# Altium schematic symbol library Regulator_Linear.SchLib: 1538 symbols (part 9 of 9)
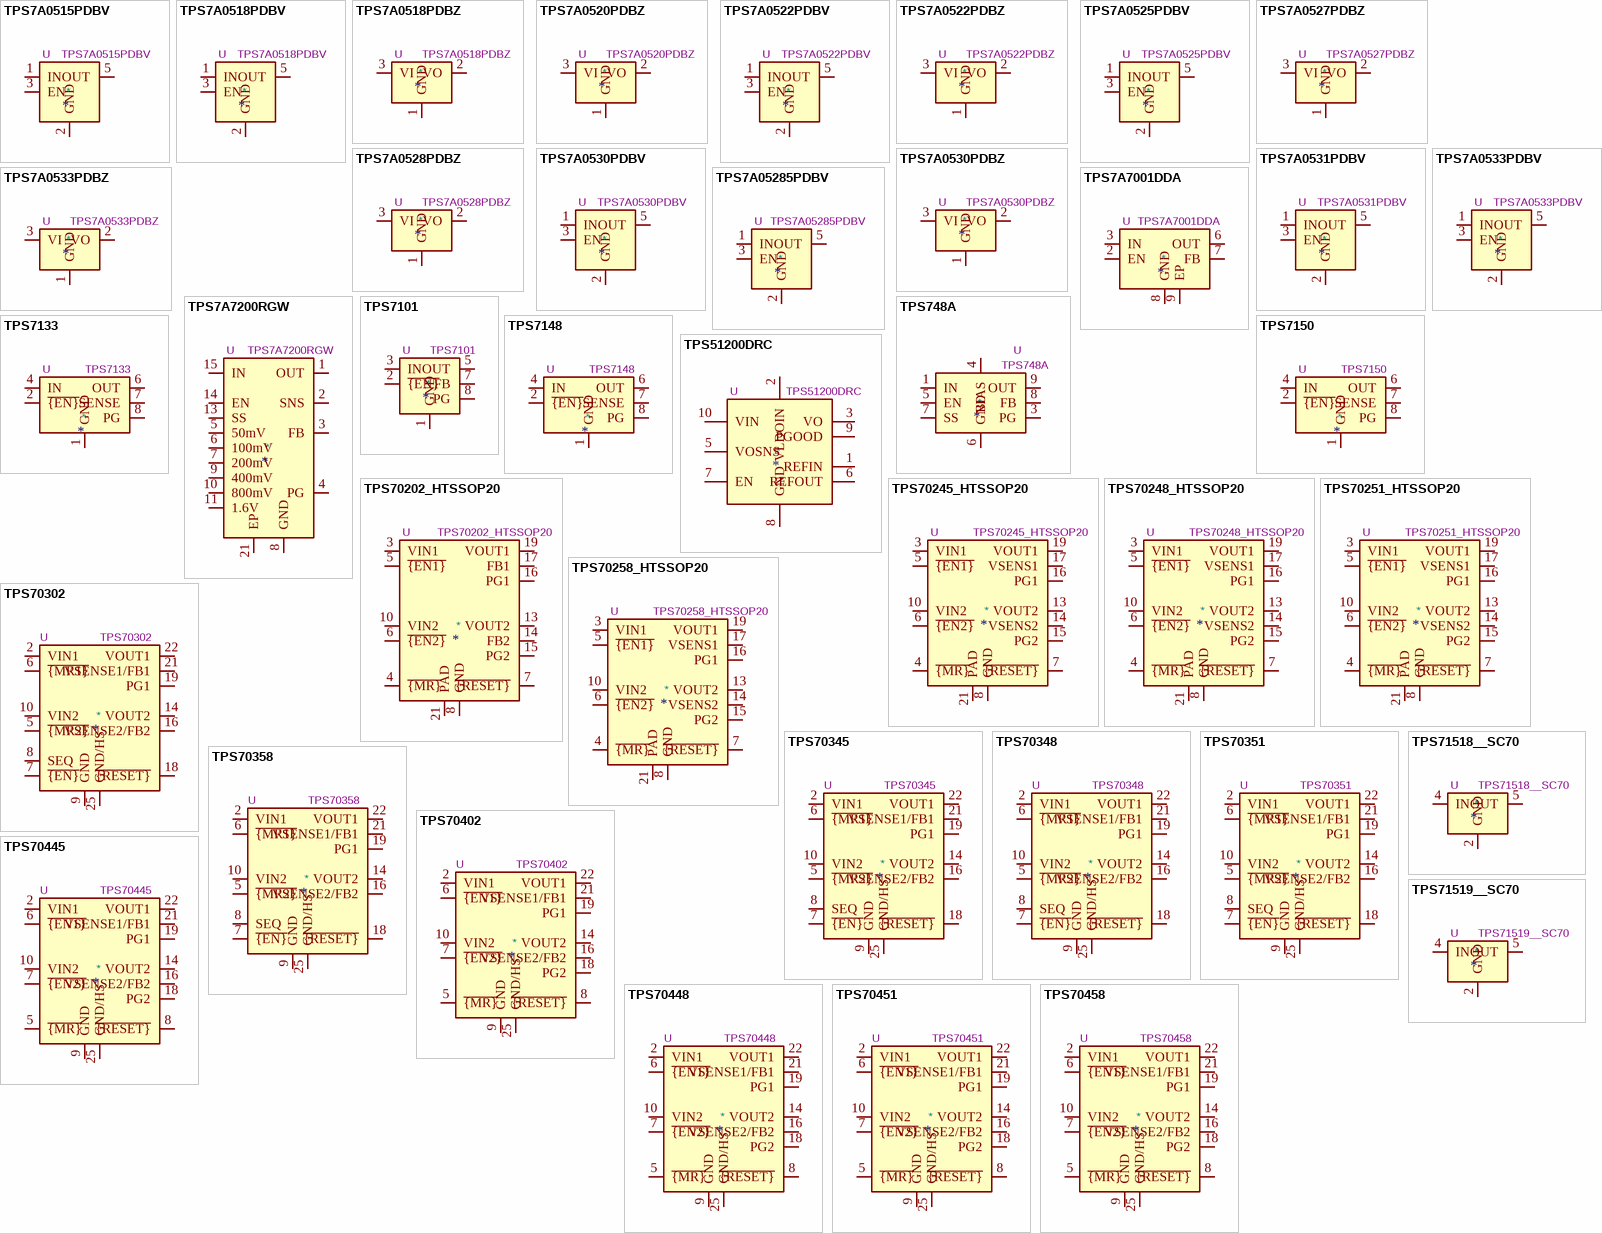
[diagram p46: symbols TPS7A0515PDBV to TPS71519__SC70]

## TPS70358
designator *  value TPS70358  Reference: U
ki_keywords: dual ldo regulator; ki_description: Dual-Output, Low Dropout Voltage Regulators With Integrated SVS For Split Voltage Systems, Sequenced Outputs, 3.3V 1A/2.5V 2A, HTSSOP-24; ki_fp_filters: HTSSOP*4.4x7.8mm*P0.65mm*; Footprint: Package_SO:HTSSOP-24-1EP_4.4x7.8mm_P0.65mm_EP3.4x7.8mm_Mask2.4x4.68mm_ThermalVias; Datasheet: http://www.ti.com/lit/ds/symlink/tps703.pdf
pins: 1 GND/HS hidden, 2 VIN1, 3 VIN1 hidden, 4 NC hidden, 5 ~{{MR2}}, 6 ~{{MR1}}, 7 ~{{EN}}, 8 SEQ, 9 GND, 10 VIN2, 11 VIN2 hidden, 12 GND/HS hidden, 13 GND/HS hidden, 14 VOUT2, 15 VOUT2 hidden, 16 VSENSE2/FB2, 17 NC hidden, 18 ~{{RESET}}, 19 PG1, 20 NC hidden, 21 VSENSE1/FB1, 22 VOUT1, 23 VOUT1 hidden, 24 GND/HS hidden, 25 GND/HS

## TPS70402
designator *  value TPS70402  Reference: U
ki_keywords: dual ldo regulator; ki_description: Dual-Output, Low Dropout Voltage Regulators With Integrated SVS For Split Voltage Systems, Independent Enable, ADJ 1A/ADJ 2A, HTSSOP-24; ki_fp_filters: HTSSOP*4.4x7.8mm*P0.65mm*; Footprint: Package_SO:HTSSOP-24-1EP_4.4x7.8mm_P0.65mm_EP3.4x7.8mm_Mask2.4x4.68mm_ThermalVias; Datasheet: http://www.ti.com/lit/ds/symlink/tps704.pdf
pins: 1 GND/HS hidden, 2 VIN1, 3 VIN1 hidden, 4 NC hidden, 5 ~{{MR}}, 6 ~{{EN1}}, 7 ~{{EN2}}, 8 ~{{RESET}}, 9 GND, 10 VIN2, 11 VIN2 hidden, 12 GND/HS hidden, 13 GND/HS hidden, 14 VOUT2, 15 VOUT2 hidden, 16 VSENSE2/FB2, 17 NC hidden, 18 PG2, 19 PG1, 20 NC hidden, 21 VSENSE1/FB1, 22 VOUT1, 23 VOUT1 hidden, 24 GND/HS hidden, 25 GND/HS

## TPS70445
designator *  value TPS70445  Reference: U
ki_keywords: dual ldo regulator; ki_description: Dual-Output, Low Dropout Voltage Regulators With Integrated SVS For Split Voltage Systems, Independent Enable, 3.3V 1A/1.2V 2A, HTSSOP-24; ki_fp_filters: HTSSOP*4.4x7.8mm*P0.65mm*; Footprint: Package_SO:HTSSOP-24-1EP_4.4x7.8mm_P0.65mm_EP3.4x7.8mm_Mask2.4x4.68mm_ThermalVias; Datasheet: http://www.ti.com/lit/ds/symlink/tps704.pdf
pins: 1 GND/HS hidden, 2 VIN1, 3 VIN1 hidden, 4 NC hidden, 5 ~{{MR}}, 6 ~{{EN1}}, 7 ~{{EN2}}, 8 ~{{RESET}}, 9 GND, 10 VIN2, 11 VIN2 hidden, 12 GND/HS hidden, 13 GND/HS hidden, 14 VOUT2, 15 VOUT2 hidden, 16 VSENSE2/FB2, 17 NC hidden, 18 PG2, 19 PG1, 20 NC hidden, 21 VSENSE1/FB1, 22 VOUT1, 23 VOUT1 hidden, 24 GND/HS hidden, 25 GND/HS

## TPS70448
designator *  value TPS70448  Reference: U
ki_keywords: dual ldo regulator; ki_description: Dual-Output, Low Dropout Voltage Regulators With Integrated SVS For Split Voltage Systems, Independent Enable, 3.3V 1A/1.5V 2A, HTSSOP-24; ki_fp_filters: HTSSOP*4.4x7.8mm*P0.65mm*; Footprint: Package_SO:HTSSOP-24-1EP_4.4x7.8mm_P0.65mm_EP3.4x7.8mm_Mask2.4x4.68mm_ThermalVias; Datasheet: http://www.ti.com/lit/ds/symlink/tps704.pdf
pins: 1 GND/HS hidden, 2 VIN1, 3 VIN1 hidden, 4 NC hidden, 5 ~{{MR}}, 6 ~{{EN1}}, 7 ~{{EN2}}, 8 ~{{RESET}}, 9 GND, 10 VIN2, 11 VIN2 hidden, 12 GND/HS hidden, 13 GND/HS hidden, 14 VOUT2, 15 VOUT2 hidden, 16 VSENSE2/FB2, 17 NC hidden, 18 PG2, 19 PG1, 20 NC hidden, 21 VSENSE1/FB1, 22 VOUT1, 23 VOUT1 hidden, 24 GND/HS hidden, 25 GND/HS

## TPS70451
designator *  value TPS70451  Reference: U
ki_keywords: dual ldo regulator; ki_description: Dual-Output, Low Dropout Voltage Regulators With Integrated SVS For Split Voltage Systems, Independent Enable, 3.3V 1A/1.8V 2A, HTSSOP-24; ki_fp_filters: HTSSOP*4.4x7.8mm*P0.65mm*; Footprint: Package_SO:HTSSOP-24-1EP_4.4x7.8mm_P0.65mm_EP3.4x7.8mm_Mask2.4x4.68mm_ThermalVias; Datasheet: http://www.ti.com/lit/ds/symlink/tps704.pdf
pins: 1 GND/HS hidden, 2 VIN1, 3 VIN1 hidden, 4 NC hidden, 5 ~{{MR}}, 6 ~{{EN1}}, 7 ~{{EN2}}, 8 ~{{RESET}}, 9 GND, 10 VIN2, 11 VIN2 hidden, 12 GND/HS hidden, 13 GND/HS hidden, 14 VOUT2, 15 VOUT2 hidden, 16 VSENSE2/FB2, 17 NC hidden, 18 PG2, 19 PG1, 20 NC hidden, 21 VSENSE1/FB1, 22 VOUT1, 23 VOUT1 hidden, 24 GND/HS hidden, 25 GND/HS

## TPS70458
designator *  value TPS70458  Reference: U
ki_keywords: dual ldo regulator; ki_description: Dual-Output, Low Dropout Voltage Regulators With Integrated SVS For Split Voltage Systems, Independent Enable, 3.3V 1A/2.5V 2A, HTSSOP-24; ki_fp_filters: HTSSOP*4.4x7.8mm*P0.65mm*; Footprint: Package_SO:HTSSOP-24-1EP_4.4x7.8mm_P0.65mm_EP3.4x7.8mm_Mask2.4x4.68mm_ThermalVias; Datasheet: http://www.ti.com/lit/ds/symlink/tps704.pdf
pins: 1 GND/HS hidden, 2 VIN1, 3 VIN1 hidden, 4 NC hidden, 5 ~{{MR}}, 6 ~{{EN1}}, 7 ~{{EN2}}, 8 ~{{RESET}}, 9 GND, 10 VIN2, 11 VIN2 hidden, 12 GND/HS hidden, 13 GND/HS hidden, 14 VOUT2, 15 VOUT2 hidden, 16 VSENSE2/FB2, 17 NC hidden, 18 PG2, 19 PG1, 20 NC hidden, 21 VSENSE1/FB1, 22 VOUT1, 23 VOUT1 hidden, 24 GND/HS hidden, 25 GND/HS

## TPS71518__SC70
designator *  value TPS71518__SC70  Reference: U
ki_keywords: LDO regulator voltage; ki_description: Low-drop Voltage Regulator, Io up to 50mA, Fixed Vo 1.8V, Ignd 3.2uA , SC70.; ki_fp_filters: *SC?70*; Footprint: Package_TO_SOT_SMD:SOT-353_SC-70-5; Datasheet: http://www.ti.com/lit/ds/symlink/tps715.pdf
pins: 1 NC hidden, 2 GND, 3 NC hidden, 4 IN, 5 OUT

## TPS71519__SC70
designator *  value TPS71519__SC70  Reference: U
ki_keywords: LDO regulator voltage; ki_description: Low-drop Voltage Regulator, Io up to 50mA, Fixed Vo 1.9V, Ignd 3.2uA , SC70.; ki_fp_filters: *SC?70*; Footprint: Package_TO_SOT_SMD:SOT-353_SC-70-5; Datasheet: http://www.ti.com/lit/ds/symlink/tps715.pdf
pins: 1 NC hidden, 2 GND, 3 NC hidden, 4 IN, 5 OUT

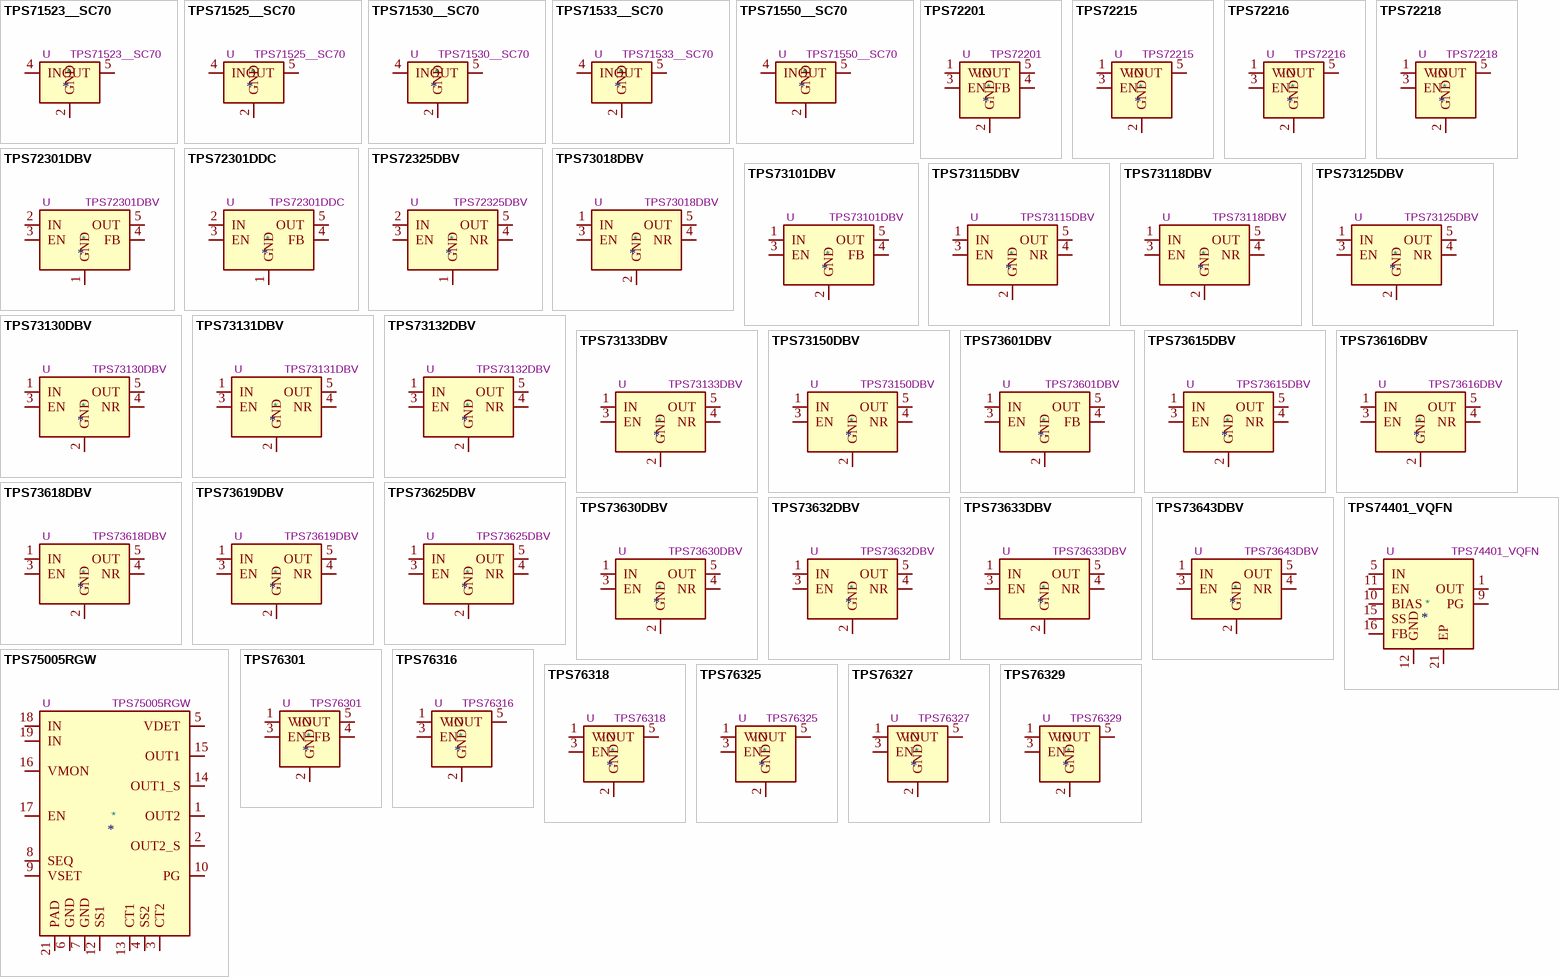
[diagram p36: symbols TPS71523__SC70 to TPS76329]

## TPS71523__SC70
designator *  value TPS71523__SC70  Reference: U
ki_keywords: LDO regulator voltage; ki_description: Low-drop Voltage Regulator, Io up to 50mA, Fixed Vo 2.3V, Ignd 3.2uA , SC70.; ki_fp_filters: *SC?70*; Footprint: Package_TO_SOT_SMD:SOT-353_SC-70-5; Datasheet: http://www.ti.com/lit/ds/symlink/tps715.pdf
pins: 1 NC hidden, 2 GND, 3 NC hidden, 4 IN, 5 OUT

## TPS71525__SC70
designator *  value TPS71525__SC70  Reference: U
ki_keywords: LDO regulator voltage; ki_description: Low-drop Voltage Regulator, Io up to 50mA, Fixed Vo 2.5V, Ignd 3.2uA , SC70.; ki_fp_filters: *SC?70*; Footprint: Package_TO_SOT_SMD:SOT-353_SC-70-5; Datasheet: http://www.ti.com/lit/ds/symlink/tps715.pdf
pins: 1 NC hidden, 2 GND, 3 NC hidden, 4 IN, 5 OUT

## TPS71530__SC70
designator *  value TPS71530__SC70  Reference: U
ki_keywords: LDO regulator voltage; ki_description: Low-drop Voltage Regulator, Io up to 50mA, Fixed Vo 3V, Ignd 3.2uA , SC70.; ki_fp_filters: *SC?70*; Footprint: Package_TO_SOT_SMD:SOT-353_SC-70-5; Datasheet: http://www.ti.com/lit/ds/symlink/tps715.pdf
pins: 1 NC hidden, 2 GND, 3 NC hidden, 4 IN, 5 OUT

## TPS71533__SC70
designator *  value TPS71533__SC70  Reference: U
ki_keywords: LDO regulator voltage; ki_description: Low-drop Voltage Regulator, Io up to 50mA, Fixed Vo 3.3V, Ignd 3.2uA , SC70.; ki_fp_filters: *SC?70*; Footprint: Package_TO_SOT_SMD:SOT-353_SC-70-5; Datasheet: http://www.ti.com/lit/ds/symlink/tps715.pdf
pins: 1 NC hidden, 2 GND, 3 NC hidden, 4 IN, 5 OUT

## TPS71550__SC70
designator *  value TPS71550__SC70  Reference: U
ki_keywords: LDO regulator voltage; ki_description: Low-drop Voltage Regulator, Io up to 50mA, Fixed Vo 5V, Ignd 3.2uA , SC70.; ki_fp_filters: *SC?70*; Footprint: Package_TO_SOT_SMD:SOT-353_SC-70-5; Datasheet: http://www.ti.com/lit/ds/symlink/tps715.pdf
pins: 1 NC hidden, 2 GND, 3 NC hidden, 4 IN, 5 OUT

## TPS72201
designator *  value TPS72201  Reference: U
ki_keywords: linear low dropout Regulator adjustable; ki_description: Low input voltage 50mA LDO variable output voltage, SOT-23-5; ki_fp_filters: SOT?23*; Footprint: Package_TO_SOT_SMD:SOT-23-5; Datasheet: http://www.ti.com/lit/ds/symlink/tps722.pdf
pins: 1 VIN, 2 GND, 3 EN, 4 FB, 5 VOUT

## TPS72215
designator *  value TPS72215  Reference: U
ki_keywords: linear low dropout Regulator fixed; ki_description: Low input voltage 50mA LDO, 1.5V fixed output voltage, SOT-23-5; ki_fp_filters: SOT?23*; Footprint: Package_TO_SOT_SMD:SOT-23-5; Datasheet: http://www.ti.com/lit/ds/symlink/tps722.pdf
pins: 1 VIN, 2 GND, 3 EN, 4 NC hidden, 5 VOUT

## TPS72216
designator *  value TPS72216  Reference: U
ki_keywords: linear low dropout Regulator fixed; ki_description: Low input voltage 50mA LDO, 1.6V fixed output voltage, SOT-23-5; ki_fp_filters: SOT?23*; Footprint: Package_TO_SOT_SMD:SOT-23-5; Datasheet: http://www.ti.com/lit/ds/symlink/tps722.pdf
pins: 1 VIN, 2 GND, 3 EN, 4 NC hidden, 5 VOUT

## TPS72218
designator *  value TPS72218  Reference: U
ki_keywords: linear low dropout Regulator fixed; ki_description: Low input voltage 50mA LDO, 1.8V fixed output voltage, SOT-23-5; ki_fp_filters: SOT?23*; Footprint: Package_TO_SOT_SMD:SOT-23-5; Datasheet: http://www.ti.com/lit/ds/symlink/tps722.pdf
pins: 1 VIN, 2 GND, 3 EN, 4 NC hidden, 5 VOUT

## TPS72301DBV
designator *  value TPS72301DBV  Reference: U
ki_description: 200-mA, Low-Noise, High-PSRR, Negative Output Low-Dropout Linear Regulator, Adjustable Output (-1.2 V to -10 V), SOT-23-5; ki_fp_filters: SOT?23*; Footprint: Package_TO_SOT_SMD:SOT-23-5; Datasheet: https://www.ti.com/lit/ds/symlink/tps723.pdf
pins: 1 GND, 2 IN, 3 EN, 4 FB, 5 OUT

## TPS72301DDC
designator *  value TPS72301DDC  Reference: U
ki_description: 200-mA, Low-Noise, High-PSRR, Negative Output Low-Dropout Linear Regulator, Adjustable Output (-1.2 V to -10 V), TSOT-23-5; ki_fp_filters: TSOT?23*; Footprint: Package_TO_SOT_SMD:TSOT-23-5; Datasheet: https://www.ti.com/lit/ds/symlink/tps723.pdf
pins: 1 GND, 2 IN, 3 EN, 4 FB, 5 OUT

## TPS72325DBV
designator *  value TPS72325DBV  Reference: U
ki_description: 200-mA, Low-Noise, High-PSRR, Negative Output Low-Dropout Linear Regulator, Fixed Output -2.5 V, SOT-23-5; ki_fp_filters: SOT?23*; Footprint: Package_TO_SOT_SMD:SOT-23-5; Datasheet: https://www.ti.com/lit/ds/symlink/tps723.pdf
pins: 1 GND, 2 IN, 3 EN, 4 NR, 5 OUT

## TPS73018DBV
designator *  value TPS73018DBV  Reference: U
ki_keywords: Fixed LDO 200mA; ki_description: Low Noise, High PSRR, 200mA Low Drop 1.8V Regulator, SOT-23-5; ki_fp_filters: SOT?23*; Footprint: Package_TO_SOT_SMD:SOT-23-5; Datasheet: https://www.ti.com/lit/ds/symlink/tps730.pdf
pins: 1 IN, 2 GND, 3 EN, 4 NR, 5 OUT

## TPS73101DBV
designator *  value TPS73101DBV  Reference: U
ki_keywords: Cap free Adjustable LDO 150mA; ki_description: Cap free NMOS 150mA Low Drop Adjustable Out Regulator, SOT-23-5; ki_fp_filters: SOT?23*; Footprint: Package_TO_SOT_SMD:SOT-23-5; Datasheet: http://www.ti.com/lit/ds/symlink/tps731.pdf
pins: 1 IN, 2 GND, 3 EN, 4 FB, 5 OUT

## TPS73115DBV
designator *  value TPS73115DBV  Reference: U
ki_keywords: Cap free Fixed LDO 150mA; ki_description: Cap free NMOS 150mA Low Drop 1.5V Regulator, SOT-23-5; ki_fp_filters: SOT?23*; Footprint: Package_TO_SOT_SMD:SOT-23-5; Datasheet: http://www.ti.com/lit/ds/symlink/tps731.pdf
pins: 1 IN, 2 GND, 3 EN, 4 NR, 5 OUT

## TPS73118DBV
designator *  value TPS73118DBV  Reference: U
ki_keywords: Cap free Fixed LDO 150mA; ki_description: Cap free NMOS 150mA Low Drop 1.8V Regulator, SOT-23-5; ki_fp_filters: SOT?23*; Footprint: Package_TO_SOT_SMD:SOT-23-5; Datasheet: http://www.ti.com/lit/ds/symlink/tps731.pdf
pins: 1 IN, 2 GND, 3 EN, 4 NR, 5 OUT

## TPS73125DBV
designator *  value TPS73125DBV  Reference: U
ki_keywords: Cap free Fixed LDO 150mA; ki_description: Cap free NMOS 150mA Low Drop 2.5V Regulator, SOT-23-5; ki_fp_filters: SOT?23*; Footprint: Package_TO_SOT_SMD:SOT-23-5; Datasheet: http://www.ti.com/lit/ds/symlink/tps731.pdf
pins: 1 IN, 2 GND, 3 EN, 4 NR, 5 OUT

## TPS73130DBV
designator *  value TPS73130DBV  Reference: U
ki_keywords: Cap free Fixed LDO 150mA; ki_description: Cap free NMOS 150mA Low Drop 3.0V Regulator, SOT-23-5; ki_fp_filters: SOT?23*; Footprint: Package_TO_SOT_SMD:SOT-23-5; Datasheet: http://www.ti.com/lit/ds/symlink/tps731.pdf
pins: 1 IN, 2 GND, 3 EN, 4 NR, 5 OUT

## TPS73131DBV
designator *  value TPS73131DBV  Reference: U
ki_keywords: Cap free Fixed LDO 150mA; ki_description: Cap free NMOS 150mA Low Drop 3.1V Regulator, SOT-23-5; ki_fp_filters: SOT?23*; Footprint: Package_TO_SOT_SMD:SOT-23-5; Datasheet: http://www.ti.com/lit/ds/symlink/tps731.pdf
pins: 1 IN, 2 GND, 3 EN, 4 NR, 5 OUT

## TPS73132DBV
designator *  value TPS73132DBV  Reference: U
ki_keywords: Cap free Fixed LDO 150mA; ki_description: Cap free NMOS 150mA Low Drop 3.2V Regulator, SOT-23-5; ki_fp_filters: SOT?23*; Footprint: Package_TO_SOT_SMD:SOT-23-5; Datasheet: http://www.ti.com/lit/ds/symlink/tps731.pdf
pins: 1 IN, 2 GND, 3 EN, 4 NR, 5 OUT

## TPS73133DBV
designator *  value TPS73133DBV  Reference: U
ki_keywords: Cap free Fixed LDO 150mA; ki_description: Cap free NMOS 150mA Low Drop 3.3V Regulator, SOT-23-5; ki_fp_filters: SOT?23*; Footprint: Package_TO_SOT_SMD:SOT-23-5; Datasheet: http://www.ti.com/lit/ds/symlink/tps731.pdf
pins: 1 IN, 2 GND, 3 EN, 4 NR, 5 OUT

## TPS73150DBV
designator *  value TPS73150DBV  Reference: U
ki_keywords: Cap free Fixed LDO 150mA; ki_description: Cap free NMOS 150mA Low Drop 5.0V Regulator, SOT-23-5; ki_fp_filters: SOT?23*; Footprint: Package_TO_SOT_SMD:SOT-23-5; Datasheet: http://www.ti.com/lit/ds/symlink/tps731.pdf
pins: 1 IN, 2 GND, 3 EN, 4 NR, 5 OUT

## TPS73601DBV
designator *  value TPS73601DBV  Reference: U
ki_keywords: Cap free Adjustable LDO 400mA; ki_description: Cap free NMOS 400mA Low Drop Adjustable Out Regulator, SOT-23-5; ki_fp_filters: SOT?23*; Footprint: Package_TO_SOT_SMD:SOT-23-5; Datasheet: http://www.ti.com/lit/ds/symlink/tps736.pdf
pins: 1 IN, 2 GND, 3 EN, 4 FB, 5 OUT

## TPS73615DBV
designator *  value TPS73615DBV  Reference: U
ki_keywords: Cap free Fixed LDO 400mA; ki_description: Cap free NMOS 400mA Low Drop 1.5V Regulator, SOT-23-5; ki_fp_filters: SOT?23*; Footprint: Package_TO_SOT_SMD:SOT-23-5; Datasheet: http://www.ti.com/lit/ds/symlink/tps736.pdf
pins: 1 IN, 2 GND, 3 EN, 4 NR, 5 OUT

## TPS73616DBV
designator *  value TPS73616DBV  Reference: U
ki_keywords: Cap free Fixed LDO 400mA; ki_description: Cap free NMOS 400mA Low Drop 1.6V Regulator, SOT-23-5; ki_fp_filters: SOT?23*; Footprint: Package_TO_SOT_SMD:SOT-23-5; Datasheet: http://www.ti.com/lit/ds/symlink/tps736.pdf
pins: 1 IN, 2 GND, 3 EN, 4 NR, 5 OUT

## TPS73618DBV
designator *  value TPS73618DBV  Reference: U
ki_keywords: Cap free Fixed LDO 400mA; ki_description: Cap free NMOS 400mA Low Drop 1.8V Regulator, SOT-23-5; ki_fp_filters: SOT?23*; Footprint: Package_TO_SOT_SMD:SOT-23-5; Datasheet: http://www.ti.com/lit/ds/symlink/tps736.pdf
pins: 1 IN, 2 GND, 3 EN, 4 NR, 5 OUT

## TPS73619DBV
designator *  value TPS73619DBV  Reference: U
ki_keywords: Cap free Fixed LDO 400mA; ki_description: Cap free NMOS 400mA Low Drop 1.9V Regulator, SOT-23-5; ki_fp_filters: SOT?23*; Footprint: Package_TO_SOT_SMD:SOT-23-5; Datasheet: http://www.ti.com/lit/ds/symlink/tps736.pdf
pins: 1 IN, 2 GND, 3 EN, 4 NR, 5 OUT

## TPS73625DBV
designator *  value TPS73625DBV  Reference: U
ki_keywords: Cap free Fixed LDO 400mA; ki_description: Cap free NMOS 400mA Low Drop 2.5V Regulator, SOT-23-5; ki_fp_filters: SOT?23*; Footprint: Package_TO_SOT_SMD:SOT-23-5; Datasheet: http://www.ti.com/lit/ds/symlink/tps736.pdf
pins: 1 IN, 2 GND, 3 EN, 4 NR, 5 OUT

## TPS73630DBV
designator *  value TPS73630DBV  Reference: U
ki_keywords: Cap free Fixed LDO 400mA; ki_description: Cap free NMOS 400mA Low Drop 3.0V Regulator, SOT-23-5; ki_fp_filters: SOT?23*; Footprint: Package_TO_SOT_SMD:SOT-23-5; Datasheet: http://www.ti.com/lit/ds/symlink/tps736.pdf
pins: 1 IN, 2 GND, 3 EN, 4 NR, 5 OUT

## TPS73632DBV
designator *  value TPS73632DBV  Reference: U
ki_keywords: Cap free Fixed LDO 400mA; ki_description: Cap free NMOS 400mA Low Drop 3.2V Regulator, SOT-23-5; ki_fp_filters: SOT?23*; Footprint: Package_TO_SOT_SMD:SOT-23-5; Datasheet: http://www.ti.com/lit/ds/symlink/tps736.pdf
pins: 1 IN, 2 GND, 3 EN, 4 NR, 5 OUT

## TPS73633DBV
designator *  value TPS73633DBV  Reference: U
ki_keywords: Cap free Fixed LDO 400mA; ki_description: Cap free NMOS 400mA Low Drop 3.3V Regulator, SOT-23-5; ki_fp_filters: SOT?23*; Footprint: Package_TO_SOT_SMD:SOT-23-5; Datasheet: http://www.ti.com/lit/ds/symlink/tps736.pdf
pins: 1 IN, 2 GND, 3 EN, 4 NR, 5 OUT

## TPS73643DBV
designator *  value TPS73643DBV  Reference: U
ki_keywords: Cap free Fixed LDO 400mA; ki_description: Cap free NMOS 400mA Low Drop 4.3V Regulator, SOT-23-5; ki_fp_filters: SOT?23*; Footprint: Package_TO_SOT_SMD:SOT-23-5; Datasheet: http://www.ti.com/lit/ds/symlink/tps736.pdf
pins: 1 IN, 2 GND, 3 EN, 4 NR, 5 OUT

## TPS74401_VQFN
designator *  value TPS74401_VQFN  Reference: U
ki_keywords: LDO Voltage Regulator; ki_description: 0.8 to 3.6V adjustable, 3.0-A, Ultra-LDO with Programmable Soft-Start; ki_fp_filters: Texas*VQFN*RGR* Texas*VQFN*RGW*; Datasheet: http://www.ti.com/general/docs/lit/getliterature.tsp?genericPartNumber=tps74401&fileType=pdf
pins: 1 OUT, 2 NC hidden, 3 NC hidden, 4 NC hidden, 5 IN, 6 IN hidden, 7 IN hidden, 8 IN hidden, 9 PG, 10 BIAS, 11 EN, 12 GND, 13 NC hidden, 14 NC hidden, 15 SS, 16 FB, 17 NC hidden, 18 OUT hidden, 19 OUT hidden, 20 OUT hidden, 21 EP

## TPS75005RGW
designator *  value TPS75005RGW  Reference: U
ki_keywords: Dual LDO Regulator Dual Integrated Power SVS Supervisor; ki_description: Integrated MCU Power Solution, Dual Low Drop-Out Regulator 500mA with Supervisor, VQFN20; ki_fp_filters: QFN*5x5mm*P0.65mm*; Footprint: Package_DFN_QFN:QFN-20-1EP_5x5mm_P0.65mm_EP3.35x3.35mm; Datasheet: http://www.ti.com/lit/ds/symlink/tps75005.pdf
pins: 1 OUT2, 2 OUT2_S, 3 CT2, 4 SS2, 5 VDET, 6 GND, 7 GND, 8 SEQ, 9 VSET, 10 PG, 11 TEST hidden, 12 SS1, 13 CT1, 14 OUT1_S, 15 OUT1, 16 VMON, 17 EN, 18 IN, 19 IN, 20 NC hidden, 21 PAD

## TPS76301
designator *  value TPS76301  Reference: U
ki_keywords: linear low dropout Regulator adjustable; ki_description: Low power 150mA LDO variable output voltage, SOT-23-5; ki_fp_filters: SOT?23*; Footprint: Package_TO_SOT_SMD:SOT-23-5; Datasheet: http://www.ti.com/lit/ds/symlink/tps763.pdf
pins: 1 VIN, 2 GND, 3 EN, 4 FB, 5 VOUT

## TPS76316
designator *  value TPS76316  Reference: U
ki_keywords: linear low dropout Regulator; ki_description: Low power 150mA LDO, 1.6V fixed output voltage, SOT-23-5; ki_fp_filters: SOT?23*; Footprint: Package_TO_SOT_SMD:SOT-23-5; Datasheet: http://www.ti.com/lit/ds/symlink/tps763.pdf
pins: 1 VIN, 2 GND, 3 EN, 4 NC hidden, 5 VOUT

## TPS76318
designator *  value TPS76318  Reference: U
ki_keywords: linear low dropout Regulator fixed; ki_description: Low power 150mA LDO 1.8V fixed output voltage, SOT-23-5; ki_fp_filters: SOT?23*; Footprint: Package_TO_SOT_SMD:SOT-23-5; Datasheet: http://www.ti.com/lit/ds/symlink/tps763.pdf
pins: 1 VIN, 2 GND, 3 EN, 4 NC hidden, 5 VOUT

## TPS76325
designator *  value TPS76325  Reference: U
ki_keywords: linear low dropout Regulator fixed; ki_description: Low power 150mA LDO 2.5V fixed output voltage, SOT-23-5; ki_fp_filters: SOT?23*; Footprint: Package_TO_SOT_SMD:SOT-23-5; Datasheet: http://www.ti.com/lit/ds/symlink/tps763.pdf
pins: 1 VIN, 2 GND, 3 EN, 4 NC hidden, 5 VOUT

## TPS76327
designator *  value TPS76327  Reference: U
ki_keywords: linear low dropout Regulator fixed; ki_description: Low power 150mA LDO 2.7V fixed output voltage, SOT-23-5; ki_fp_filters: SOT?23*; Footprint: Package_TO_SOT_SMD:SOT-23-5; Datasheet: http://www.ti.com/lit/ds/symlink/tps763.pdf
pins: 1 VIN, 2 GND, 3 EN, 4 NC hidden, 5 VOUT

## TPS76329
designator *  value TPS76329  Reference: U
ki_keywords: linear low dropout Regulator fixed; ki_description: Low power 150mA LDO 2.8V fixed output voltage, SOT-23-5; ki_fp_filters: SOT?23*; Footprint: Package_TO_SOT_SMD:SOT-23-5; Datasheet: http://www.ti.com/lit/ds/symlink/tps763.pdf
pins: 1 VIN, 2 GND, 3 EN, 4 NC hidden, 5 VOUT
